# Altium integrated library Weidmueller_OMNIMATE_Signal.IntLib: 2550 symbols (part 18 of 45)
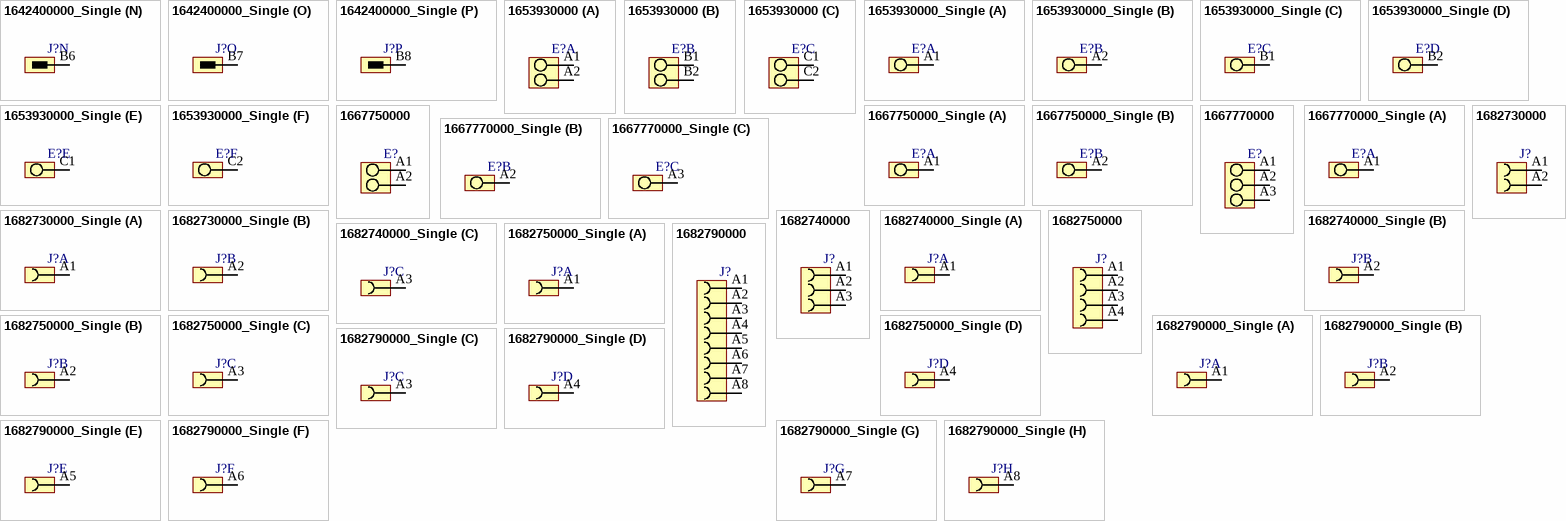
[diagram p228: symbols 1642400000_Single to 1682790000_Single]

## 1667750000_Single
designator E?
OMNIMATE Signal - series LM; PartNumber: 1667750000; Manufacturer: Weidmueller; Short_text_for_material: LM 3.50/02/90 3.2SN OR BX; Side_termination_characteristic: closed side; Mounting_onto_the_PCB: Solder connection; Pitch_mm: 3,5 mm; Pitch_inch: 0,138 inch; No_of_poles: 2; Solder_pin_length_mm: 3,2 mm; Contact_material: Cu-Leg; Contact_surface: tinned; Insulating_material: PA; UL_94_flammability_rating: V-2; Rated_voltage_for_surge_voltage_class_pollution_degree_II_2: 320 V; Rated_current_min_no_of_poles_TU_20_deg_C: 32 A; Solid_min_H05_07_V_U: 0,5 mm²; Solid_max_H05_07_V_U: 1,5 mm²; Rated_voltage_use_group_B_UL_1059: 300 V; Rated_current_use_group_B_UL_1059: 10 A; Wire_cross_section_AWG_min_UL_1059: AWG 28; Wire_cross_section_AWG_max_UL_1059: AWG 14; PackageReference: LM_3_5_90_02; Colour: Orange; Packaging: Box; Qty: 100 PCS; Revision: V1; ComponentLink1Description: Manufacturer URL; ComponentLink1URL: http://www.weidmueller.com/; ComponentLink2Description: URL Link1; ComponentLink2URL: http://catalog.weidmueller.com/catalog/Start.do?localeId=en&ObjectID=1667750000
footprint LM_3_5_90_02 (OMNIMATE Signal - Serie LM  LM 3.50/02/90 3.2)
part A pins: A1
part B pins: A2
1 alternate drawing of the same symbol

## 1667770000
designator E?
OMNIMATE Signal - series LM; PartNumber: 1667770000; Manufacturer: Weidmueller; Short_text_for_material: LM 3.50/03/90 3.2SN OR BX; Side_termination_characteristic: closed side; Mounting_onto_the_PCB: Solder connection; Pitch_mm: 3,5 mm; Pitch_inch: 0,138 inch; No_of_poles: 3; Solder_pin_length_mm: 3,2 mm; Contact_material: Cu-Leg; Contact_surface: tinned; Insulating_material: PA; UL_94_flammability_rating: V-2; Rated_voltage_for_surge_voltage_class_pollution_degree_II_2: 320 V; Rated_current_min_no_of_poles_TU_20_deg_C: 32 A; Solid_min_H05_07_V_U: 0,5 mm²; Solid_max_H05_07_V_U: 1,5 mm²; Rated_voltage_use_group_B_UL_1059: 300 V; Rated_current_use_group_B_UL_1059: 10 A; Wire_cross_section_AWG_min_UL_1059: AWG 28; Wire_cross_section_AWG_max_UL_1059: AWG 14; PackageReference: LM_3_5_90_03; Colour: Orange; Packaging: Box; Qty: 100 PCS; Revision: V1; ComponentLink1Description: Manufacturer URL; ComponentLink1URL: http://www.weidmueller.com/; ComponentLink2Description: URL Link1; ComponentLink2URL: http://catalog.weidmueller.com/catalog/Start.do?localeId=en&ObjectID=1667770000
footprint LM_3_5_90_03 (OMNIMATE Signal - Serie LM  LM 3.50/03/90 3.2)
pins: A1, A2, A3
1 alternate drawing of the same symbol

## 1667770000_Single
designator E?
OMNIMATE Signal - series LM; PartNumber: 1667770000; Manufacturer: Weidmueller; Short_text_for_material: LM 3.50/03/90 3.2SN OR BX; Side_termination_characteristic: closed side; Mounting_onto_the_PCB: Solder connection; Pitch_mm: 3,5 mm; Pitch_inch: 0,138 inch; No_of_poles: 3; Solder_pin_length_mm: 3,2 mm; Contact_material: Cu-Leg; Contact_surface: tinned; Insulating_material: PA; UL_94_flammability_rating: V-2; Rated_voltage_for_surge_voltage_class_pollution_degree_II_2: 320 V; Rated_current_min_no_of_poles_TU_20_deg_C: 32 A; Solid_min_H05_07_V_U: 0,5 mm²; Solid_max_H05_07_V_U: 1,5 mm²; Rated_voltage_use_group_B_UL_1059: 300 V; Rated_current_use_group_B_UL_1059: 10 A; Wire_cross_section_AWG_min_UL_1059: AWG 28; Wire_cross_section_AWG_max_UL_1059: AWG 14; PackageReference: LM_3_5_90_03; Colour: Orange; Packaging: Box; Qty: 100 PCS; Revision: V1; ComponentLink1Description: Manufacturer URL; ComponentLink1URL: http://www.weidmueller.com/; ComponentLink2Description: URL Link1; ComponentLink2URL: http://catalog.weidmueller.com/catalog/Start.do?localeId=en&ObjectID=1667770000
footprint LM_3_5_90_03 (OMNIMATE Signal - Serie LM  LM 3.50/03/90 3.2)
part A pins: A1
part B pins: A2
part C pins: A3
1 alternate drawing of the same symbol

## 1682730000
designator J?
OMNIMATE Signal - series BL/SL 5.08; PartNumber: 1682730000; Manufacturer: Weidmueller; Short_text_for_material: BLL 5.08/02/180B 3.2SN OR BX; Side_termination_characteristic: Dovetails for fixing blocks; Mounting_onto_the_PCB: Solder connection; Pitch_mm: 5.08 mm; Pitch_inch: 0.2 inch; No_of_poles: 2; Outgoing_elbow: 180°; Solder_pin_length_mm: 3.2 mm; Contact_material: Cu-Leg; Contact_surface: tinned; Insulating_material: PBT GF; UL_94_flammability_rating: V-0; Rated_voltage_for_surge_voltage_class_pollution_degree_II_2: 400 V; Rated_current_min_no_of_poles_TU_20_deg_C: 32 A; Rated_voltage_use_group_B_UL_1059: 300 V; Rated_current_use_group_B_UL_1059: 15 A; PackageReference: BLL_5_08_180B_02; Colour: Orange; Packaging: Box; Qty: 150 PCS; Revision: V1; ComponentLink1Description: Manufacturer URL; ComponentLink1URL: http://www.weidmueller.com/; ComponentLink2Description: URL Link1; ComponentLink2URL: http://catalog.weidmueller.com/catalog/Start.do?localeId=en&ObjectID=1682730000
footprint BLL_5_08_180B_02 (OMNIMATE Signal - Serie BL/SL 5.08  BLL 5.08/02/180B 3.2)
pins: A1, A2

## 1682730000_Single
designator J?
OMNIMATE Signal - series BL/SL 5.08; PartNumber: 1682730000; Manufacturer: Weidmueller; Short_text_for_material: BLL 5.08/02/180B 3.2SN OR BX; Side_termination_characteristic: Dovetails for fixing blocks; Mounting_onto_the_PCB: Solder connection; Pitch_mm: 5.08 mm; Pitch_inch: 0.2 inch; No_of_poles: 2; Outgoing_elbow: 180°; Solder_pin_length_mm: 3.2 mm; Contact_material: Cu-Leg; Contact_surface: tinned; Insulating_material: PBT GF; UL_94_flammability_rating: V-0; Rated_voltage_for_surge_voltage_class_pollution_degree_II_2: 400 V; Rated_current_min_no_of_poles_TU_20_deg_C: 32 A; Rated_voltage_use_group_B_UL_1059: 300 V; Rated_current_use_group_B_UL_1059: 15 A; PackageReference: BLL_5_08_180B_02; Colour: Orange; Packaging: Box; Qty: 150 PCS; Revision: V1; ComponentLink1Description: Manufacturer URL; ComponentLink1URL: http://www.weidmueller.com/; ComponentLink2Description: URL Link1; ComponentLink2URL: http://catalog.weidmueller.com/catalog/Start.do?localeId=en&ObjectID=1682730000
footprint BLL_5_08_180B_02 (OMNIMATE Signal - Serie BL/SL 5.08  BLL 5.08/02/180B 3.2)
part A pins: A1
part B pins: A2

## 1682740000
designator J?
OMNIMATE Signal - series BL/SL 5.08; PartNumber: 1682740000; Manufacturer: Weidmueller; Short_text_for_material: BLL 5.08/03/180B 3.2SN OR BX; Side_termination_characteristic: Dovetails for fixing blocks; Mounting_onto_the_PCB: Solder connection; Pitch_mm: 5.08 mm; Pitch_inch: 0.2 inch; No_of_poles: 3; Outgoing_elbow: 180°; Solder_pin_length_mm: 3.2 mm; Contact_material: Cu-Leg; Contact_surface: tinned; Insulating_material: PBT GF; UL_94_flammability_rating: V-0; Rated_voltage_for_surge_voltage_class_pollution_degree_II_2: 400 V; Rated_current_min_no_of_poles_TU_20_deg_C: 32 A; Rated_voltage_use_group_B_UL_1059: 300 V; Rated_current_use_group_B_UL_1059: 15 A; PackageReference: BLL_5_08_180B_03; Colour: Orange; Packaging: Box; Qty: 108 PCS; Revision: V1; ComponentLink1Description: Manufacturer URL; ComponentLink1URL: http://www.weidmueller.com/; ComponentLink2Description: URL Link1; ComponentLink2URL: http://catalog.weidmueller.com/catalog/Start.do?localeId=en&ObjectID=1682740000
footprint BLL_5_08_180B_03 (OMNIMATE Signal - Serie BL/SL 5.08  BLL 5.08/03/180B 3.2)
pins: A1, A2, A3

## 1682740000_Single
designator J?
OMNIMATE Signal - series BL/SL 5.08; PartNumber: 1682740000; Manufacturer: Weidmueller; Short_text_for_material: BLL 5.08/03/180B 3.2SN OR BX; Side_termination_characteristic: Dovetails for fixing blocks; Mounting_onto_the_PCB: Solder connection; Pitch_mm: 5.08 mm; Pitch_inch: 0.2 inch; No_of_poles: 3; Outgoing_elbow: 180°; Solder_pin_length_mm: 3.2 mm; Contact_material: Cu-Leg; Contact_surface: tinned; Insulating_material: PBT GF; UL_94_flammability_rating: V-0; Rated_voltage_for_surge_voltage_class_pollution_degree_II_2: 400 V; Rated_current_min_no_of_poles_TU_20_deg_C: 32 A; Rated_voltage_use_group_B_UL_1059: 300 V; Rated_current_use_group_B_UL_1059: 15 A; PackageReference: BLL_5_08_180B_03; Colour: Orange; Packaging: Box; Qty: 108 PCS; Revision: V1; ComponentLink1Description: Manufacturer URL; ComponentLink1URL: http://www.weidmueller.com/; ComponentLink2Description: URL Link1; ComponentLink2URL: http://catalog.weidmueller.com/catalog/Start.do?localeId=en&ObjectID=1682740000
footprint BLL_5_08_180B_03 (OMNIMATE Signal - Serie BL/SL 5.08  BLL 5.08/03/180B 3.2)
part A pins: A1
part B pins: A2
part C pins: A3

## 1682750000
designator J?
OMNIMATE Signal - series BL/SL 5.08; PartNumber: 1682750000; Manufacturer: Weidmueller; Short_text_for_material: BLL 5.08/04/180B 3.2SN OR BX; Side_termination_characteristic: Dovetails for fixing blocks; Mounting_onto_the_PCB: Solder connection; Pitch_mm: 5.08 mm; Pitch_inch: 0.2 inch; No_of_poles: 4; Outgoing_elbow: 180°; Solder_pin_length_mm: 3.2 mm; Contact_material: Cu-Leg; Contact_surface: tinned; Insulating_material: PBT GF; UL_94_flammability_rating: V-0; Rated_voltage_for_surge_voltage_class_pollution_degree_II_2: 400 V; Rated_current_min_no_of_poles_TU_20_deg_C: 32 A; Rated_voltage_use_group_B_UL_1059: 300 V; Rated_current_use_group_B_UL_1059: 15 A; PackageReference: BLL_5_08_180B_04; Colour: Orange; Packaging: Box; Qty: 78 PCS; Revision: V1; ComponentLink1Description: Manufacturer URL; ComponentLink1URL: http://www.weidmueller.com/; ComponentLink2Description: URL Link1; ComponentLink2URL: http://catalog.weidmueller.com/catalog/Start.do?localeId=en&ObjectID=1682750000
footprint BLL_5_08_180B_04 (OMNIMATE Signal - Serie BL/SL 5.08  BLL 5.08/04/180B 3.2)
pins: A1, A2, A3, A4

## 1682750000_Single
designator J?
OMNIMATE Signal - series BL/SL 5.08; PartNumber: 1682750000; Manufacturer: Weidmueller; Short_text_for_material: BLL 5.08/04/180B 3.2SN OR BX; Side_termination_characteristic: Dovetails for fixing blocks; Mounting_onto_the_PCB: Solder connection; Pitch_mm: 5.08 mm; Pitch_inch: 0.2 inch; No_of_poles: 4; Outgoing_elbow: 180°; Solder_pin_length_mm: 3.2 mm; Contact_material: Cu-Leg; Contact_surface: tinned; Insulating_material: PBT GF; UL_94_flammability_rating: V-0; Rated_voltage_for_surge_voltage_class_pollution_degree_II_2: 400 V; Rated_current_min_no_of_poles_TU_20_deg_C: 32 A; Rated_voltage_use_group_B_UL_1059: 300 V; Rated_current_use_group_B_UL_1059: 15 A; PackageReference: BLL_5_08_180B_04; Colour: Orange; Packaging: Box; Qty: 78 PCS; Revision: V1; ComponentLink1Description: Manufacturer URL; ComponentLink1URL: http://www.weidmueller.com/; ComponentLink2Description: URL Link1; ComponentLink2URL: http://catalog.weidmueller.com/catalog/Start.do?localeId=en&ObjectID=1682750000
footprint BLL_5_08_180B_04 (OMNIMATE Signal - Serie BL/SL 5.08  BLL 5.08/04/180B 3.2)
part A pins: A1
part B pins: A2
part C pins: A3
part D pins: A4

## 1682790000
designator J?
OMNIMATE Signal - series BL/SL 5.08; PartNumber: 1682790000; Manufacturer: Weidmueller; Short_text_for_material: BLL 5.08/08/180B 3.2SN OR BX; Side_termination_characteristic: Dovetails for fixing blocks; Mounting_onto_the_PCB: Solder connection; Pitch_mm: 5.08 mm; Pitch_inch: 0.2 inch; No_of_poles: 8; Outgoing_elbow: 180°; Solder_pin_length_mm: 3.2 mm; Contact_material: Cu-Leg; Contact_surface: tinned; Insulating_material: PBT GF; UL_94_flammability_rating: V-0; Rated_voltage_for_surge_voltage_class_pollution_degree_II_2: 400 V; Rated_current_min_no_of_poles_TU_20_deg_C: 32 A; Rated_voltage_use_group_B_UL_1059: 300 V; Rated_current_use_group_B_UL_1059: 15 A; PackageReference: BLL_5_08_180B_08; Colour: Orange; Packaging: Box; Qty: 42 PCS; Revision: V1; ComponentLink1Description: Manufacturer URL; ComponentLink1URL: http://www.weidmueller.com/; ComponentLink2Description: URL Link1; ComponentLink2URL: http://catalog.weidmueller.com/catalog/Start.do?localeId=en&ObjectID=1682790000
footprint BLL_5_08_180B_08 (OMNIMATE Signal - Serie BL/SL 5.08  BLL 5.08/08/180B 3.2)
pins: A1, A2, A3, A4, A5, A6, A7, A8

## 1682790000_Single
designator J?
OMNIMATE Signal - series BL/SL 5.08; PartNumber: 1682790000; Manufacturer: Weidmueller; Short_text_for_material: BLL 5.08/08/180B 3.2SN OR BX; Side_termination_characteristic: Dovetails for fixing blocks; Mounting_onto_the_PCB: Solder connection; Pitch_mm: 5.08 mm; Pitch_inch: 0.2 inch; No_of_poles: 8; Outgoing_elbow: 180°; Solder_pin_length_mm: 3.2 mm; Contact_material: Cu-Leg; Contact_surface: tinned; Insulating_material: PBT GF; UL_94_flammability_rating: V-0; Rated_voltage_for_surge_voltage_class_pollution_degree_II_2: 400 V; Rated_current_min_no_of_poles_TU_20_deg_C: 32 A; Rated_voltage_use_group_B_UL_1059: 300 V; Rated_current_use_group_B_UL_1059: 15 A; PackageReference: BLL_5_08_180B_08; Colour: Orange; Packaging: Box; Qty: 42 PCS; Revision: V1; ComponentLink1Description: Manufacturer URL; ComponentLink1URL: http://www.weidmueller.com/; ComponentLink2Description: URL Link1; ComponentLink2URL: http://catalog.weidmueller.com/catalog/Start.do?localeId=en&ObjectID=1682790000
footprint BLL_5_08_180B_08 (OMNIMATE Signal - Serie BL/SL 5.08  BLL 5.08/08/180B 3.2)
part A pins: A1
part B pins: A2
part C pins: A3
part D pins: A4
part E pins: A5
part F pins: A6
part G pins: A7
part H pins: A8

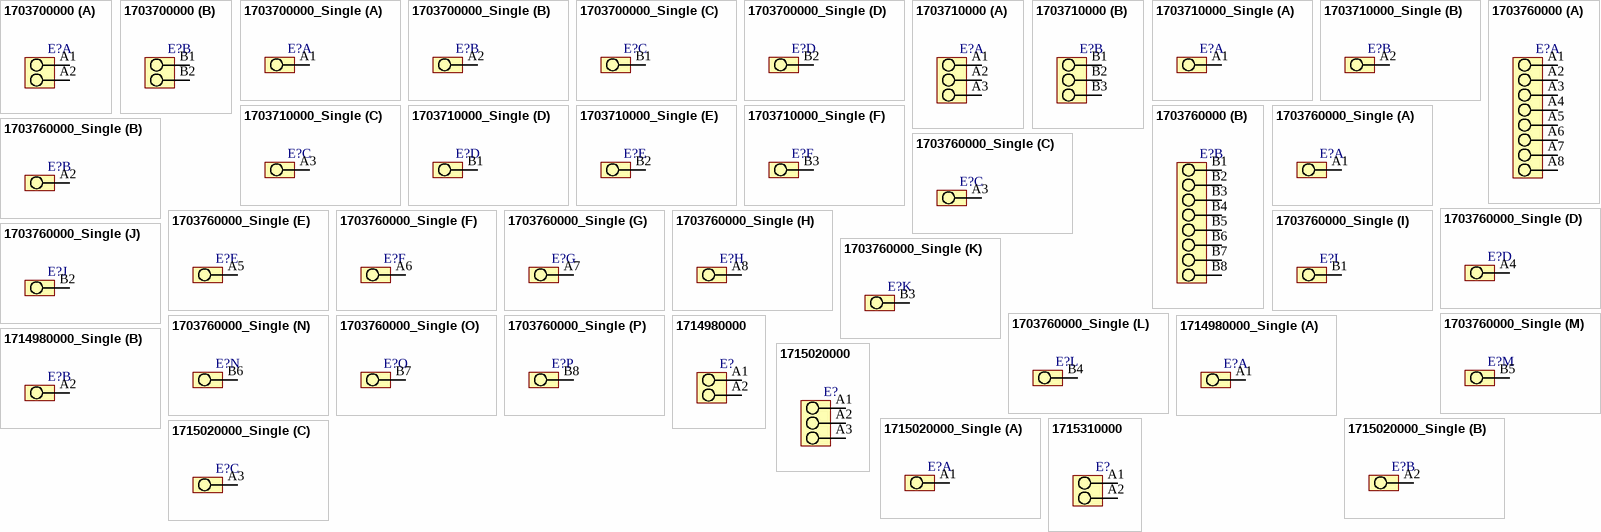
[diagram p98: symbols 1703700000 to 1715310000]

## 1703700000
designator E?
OMNIMATE Signal - series LM; PartNumber: 1703700000; Manufacturer: Weidmueller; Short_text_for_material: LM2N 3.50/04/90 3.2SN OR BX; Side_termination_characteristic: closed side; Mounting_onto_the_PCB: Solder connection; Pitch_mm: 3,5 mm; Pitch_inch: 0,138 inch; No_of_poles: 4; Solder_pin_length_mm: 3,2 mm; Contact_material: Cu-Leg; Contact_surface: tinned; Insulating_material: PA; UL_94_flammability_rating: V-2; Rated_voltage_for_surge_voltage_class_pollution_degree_II_2: 320 V; Solid_min_H05_07_V_U: 0,5 mm²; Solid_max_H05_07_V_U: 1,5 mm²; Rated_voltage_use_group_B_UL_1059: 300 V; Rated_current_use_group_B_UL_1059: 10 A; Wire_cross_section_AWG_min_UL_1059: AWG 28; Wire_cross_section_AWG_max_UL_1059: AWG 14; PackageReference: LM2N_3_5_04; Colour: Orange; Packaging: Box; Qty: 100 PCS; Revision: V1; ComponentLink1Description: Manufacturer URL; ComponentLink1URL: http://www.weidmueller.com/; ComponentLink2Description: URL Link1; ComponentLink2URL: http://catalog.weidmueller.com/catalog/Start.do?localeId=en&ObjectID=1703700000
footprint LM2N_3_5_04 (OMNIMATE Signal - Serie LM  LM2N 3.50/04/90 3.2)
part A pins: A1, A2
part B pins: B1, B2
1 alternate drawing of the same symbol

## 1703700000_Single
designator E?
OMNIMATE Signal - series LM; PartNumber: 1703700000; Manufacturer: Weidmueller; Short_text_for_material: LM2N 3.50/04/90 3.2SN OR BX; Side_termination_characteristic: closed side; Mounting_onto_the_PCB: Solder connection; Pitch_mm: 3,5 mm; Pitch_inch: 0,138 inch; No_of_poles: 4; Solder_pin_length_mm: 3,2 mm; Contact_material: Cu-Leg; Contact_surface: tinned; Insulating_material: PA; UL_94_flammability_rating: V-2; Rated_voltage_for_surge_voltage_class_pollution_degree_II_2: 320 V; Solid_min_H05_07_V_U: 0,5 mm²; Solid_max_H05_07_V_U: 1,5 mm²; Rated_voltage_use_group_B_UL_1059: 300 V; Rated_current_use_group_B_UL_1059: 10 A; Wire_cross_section_AWG_min_UL_1059: AWG 28; Wire_cross_section_AWG_max_UL_1059: AWG 14; PackageReference: LM2N_3_5_04; Colour: Orange; Packaging: Box; Qty: 100 PCS; Revision: V1; ComponentLink1Description: Manufacturer URL; ComponentLink1URL: http://www.weidmueller.com/; ComponentLink2Description: URL Link1; ComponentLink2URL: http://catalog.weidmueller.com/catalog/Start.do?localeId=en&ObjectID=1703700000
footprint LM2N_3_5_04 (OMNIMATE Signal - Serie LM  LM2N 3.50/04/90 3.2)
part A pins: A1
part B pins: A2
part C pins: B1
part D pins: B2
1 alternate drawing of the same symbol

## 1703710000
designator E?
OMNIMATE Signal - series LM; PartNumber: 1703710000; Manufacturer: Weidmueller; Short_text_for_material: LM2N 3.50/06/90 3.2SN OR BX; Side_termination_characteristic: closed side; Mounting_onto_the_PCB: Solder connection; Pitch_mm: 3,5 mm; Pitch_inch: 0,138 inch; No_of_poles: 6; Solder_pin_length_mm: 3,2 mm; Contact_material: Cu-Leg; Contact_surface: tinned; Insulating_material: PA; UL_94_flammability_rating: V-2; Rated_voltage_for_surge_voltage_class_pollution_degree_II_2: 320 V; Solid_min_H05_07_V_U: 0,5 mm²; Solid_max_H05_07_V_U: 1,5 mm²; Rated_voltage_use_group_B_UL_1059: 300 V; Rated_current_use_group_B_UL_1059: 10 A; Wire_cross_section_AWG_min_UL_1059: AWG 28; Wire_cross_section_AWG_max_UL_1059: AWG 14; PackageReference: LM2N_3_5_06; Colour: Orange; Packaging: Box; Qty: 100 PCS; Revision: V1; ComponentLink1Description: Manufacturer URL; ComponentLink1URL: http://www.weidmueller.com/; ComponentLink2Description: URL Link1; ComponentLink2URL: http://catalog.weidmueller.com/catalog/Start.do?localeId=en&ObjectID=1703710000
footprint LM2N_3_5_06 (OMNIMATE Signal - Serie LM  LM2N 3.50/06/90 3.2)
part A pins: A1, A2, A3
part B pins: B1, B2, B3
1 alternate drawing of the same symbol

## 1703710000_Single
designator E?
OMNIMATE Signal - series LM; PartNumber: 1703710000; Manufacturer: Weidmueller; Short_text_for_material: LM2N 3.50/06/90 3.2SN OR BX; Side_termination_characteristic: closed side; Mounting_onto_the_PCB: Solder connection; Pitch_mm: 3,5 mm; Pitch_inch: 0,138 inch; No_of_poles: 6; Solder_pin_length_mm: 3,2 mm; Contact_material: Cu-Leg; Contact_surface: tinned; Insulating_material: PA; UL_94_flammability_rating: V-2; Rated_voltage_for_surge_voltage_class_pollution_degree_II_2: 320 V; Solid_min_H05_07_V_U: 0,5 mm²; Solid_max_H05_07_V_U: 1,5 mm²; Rated_voltage_use_group_B_UL_1059: 300 V; Rated_current_use_group_B_UL_1059: 10 A; Wire_cross_section_AWG_min_UL_1059: AWG 28; Wire_cross_section_AWG_max_UL_1059: AWG 14; PackageReference: LM2N_3_5_06; Colour: Orange; Packaging: Box; Qty: 100 PCS; Revision: V1; ComponentLink1Description: Manufacturer URL; ComponentLink1URL: http://www.weidmueller.com/; ComponentLink2Description: URL Link1; ComponentLink2URL: http://catalog.weidmueller.com/catalog/Start.do?localeId=en&ObjectID=1703710000
footprint LM2N_3_5_06 (OMNIMATE Signal - Serie LM  LM2N 3.50/06/90 3.2)
part A pins: A1
part B pins: A2
part C pins: A3
part D pins: B1
part E pins: B2
part F pins: B3
1 alternate drawing of the same symbol

## 1703760000
designator E?
OMNIMATE Signal - series LM; PartNumber: 1703760000; Manufacturer: Weidmueller; Short_text_for_material: LM2N 3.50/16/90 3.2SN OR BX; Side_termination_characteristic: closed side; Mounting_onto_the_PCB: Solder connection; Pitch_mm: 3,5 mm; Pitch_inch: 0,138 inch; No_of_poles: 16; Solder_pin_length_mm: 3,2 mm; Contact_material: Cu-Leg; Contact_surface: tinned; Insulating_material: PA; UL_94_flammability_rating: V-2; Rated_voltage_for_surge_voltage_class_pollution_degree_II_2: 320 V; Solid_min_H05_07_V_U: 0,5 mm²; Solid_max_H05_07_V_U: 1,5 mm²; Rated_voltage_use_group_B_UL_1059: 300 V; Rated_current_use_group_B_UL_1059: 10 A; Wire_cross_section_AWG_min_UL_1059: AWG 28; Wire_cross_section_AWG_max_UL_1059: AWG 14; PackageReference: LM2N_3_5_16; Colour: Orange; Packaging: Box; Qty: 50 PCS; Revision: V1; ComponentLink1Description: Manufacturer URL; ComponentLink1URL: http://www.weidmueller.com/; ComponentLink2Description: URL Link1; ComponentLink2URL: http://catalog.weidmueller.com/catalog/Start.do?localeId=en&ObjectID=1703760000
footprint LM2N_3_5_16 (OMNIMATE Signal - Serie LM  LM2N 3.50/16/90 3.2)
part A pins: A1, A2, A3, A4, A5, A6, A7, A8
part B pins: B1, B2, B3, B4, B5, B6, B7, B8
1 alternate drawing of the same symbol

## 1703760000_Single
designator E?
OMNIMATE Signal - series LM; PartNumber: 1703760000; Manufacturer: Weidmueller; Short_text_for_material: LM2N 3.50/16/90 3.2SN OR BX; Side_termination_characteristic: closed side; Mounting_onto_the_PCB: Solder connection; Pitch_mm: 3,5 mm; Pitch_inch: 0,138 inch; No_of_poles: 16; Solder_pin_length_mm: 3,2 mm; Contact_material: Cu-Leg; Contact_surface: tinned; Insulating_material: PA; UL_94_flammability_rating: V-2; Rated_voltage_for_surge_voltage_class_pollution_degree_II_2: 320 V; Solid_min_H05_07_V_U: 0,5 mm²; Solid_max_H05_07_V_U: 1,5 mm²; Rated_voltage_use_group_B_UL_1059: 300 V; Rated_current_use_group_B_UL_1059: 10 A; Wire_cross_section_AWG_min_UL_1059: AWG 28; Wire_cross_section_AWG_max_UL_1059: AWG 14; PackageReference: LM2N_3_5_16; Colour: Orange; Packaging: Box; Qty: 50 PCS; Revision: V1; ComponentLink1Description: Manufacturer URL; ComponentLink1URL: http://www.weidmueller.com/; ComponentLink2Description: URL Link1; ComponentLink2URL: http://catalog.weidmueller.com/catalog/Start.do?localeId=en&ObjectID=1703760000
footprint LM2N_3_5_16 (OMNIMATE Signal - Serie LM  LM2N 3.50/16/90 3.2)
part A pins: A1
part B pins: A2
part C pins: A3
part D pins: A4
part E pins: A5
part F pins: A6
part G pins: A7
part H pins: A8
part I pins: B1
part J pins: B2
part K pins: B3
part L pins: B4
part M pins: B5
part N pins: B6
part O pins: B7
part P pins: B8
1 alternate drawing of the same symbol

## 1714980000
designator E?
OMNIMATE Signal - series LM; PartNumber: 1714980000; Manufacturer: Weidmueller; Short_text_for_material: LM 3.50/02/135 3.2SN OR BX; Side_termination_characteristic: closed side; Mounting_onto_the_PCB: Solder connection; Pitch_mm: 3,5 mm; Pitch_inch: 0,138 inch; No_of_poles: 2; Solder_pin_length_mm: 3,2 mm; Contact_material: Cu-Leg; Contact_surface: tinned; Insulating_material: PA; UL_94_flammability_rating: V-2; Rated_voltage_for_surge_voltage_class_pollution_degree_II_2: 320 V; Solid_min_H05_07_V_U: 0,5 mm²; Solid_max_H05_07_V_U: 1,5 mm²; Rated_voltage_use_group_B_UL_1059: 300 V; Rated_current_use_group_B_UL_1059: 10 A; Wire_cross_section_AWG_min_UL_1059: AWG 28; Wire_cross_section_AWG_max_UL_1059: AWG 14; PackageReference: LM_3_5_135_02; Colour: Orange; Packaging: Box; Qty: 100 PCS; Revision: V1; ComponentLink1Description: Manufacturer URL; ComponentLink1URL: http://www.weidmueller.com/; ComponentLink2Description: URL Link1; ComponentLink2URL: http://catalog.weidmueller.com/catalog/Start.do?localeId=en&ObjectID=1714980000
footprint LM_3_5_135_02 (OMNIMATE Signal - Serie LM  LM 3.50/02/135 3.2)
pins: A1, A2
1 alternate drawing of the same symbol

## 1714980000_Single
designator E?
OMNIMATE Signal - series LM; PartNumber: 1714980000; Manufacturer: Weidmueller; Short_text_for_material: LM 3.50/02/135 3.2SN OR BX; Side_termination_characteristic: closed side; Mounting_onto_the_PCB: Solder connection; Pitch_mm: 3,5 mm; Pitch_inch: 0,138 inch; No_of_poles: 2; Solder_pin_length_mm: 3,2 mm; Contact_material: Cu-Leg; Contact_surface: tinned; Insulating_material: PA; UL_94_flammability_rating: V-2; Rated_voltage_for_surge_voltage_class_pollution_degree_II_2: 320 V; Solid_min_H05_07_V_U: 0,5 mm²; Solid_max_H05_07_V_U: 1,5 mm²; Rated_voltage_use_group_B_UL_1059: 300 V; Rated_current_use_group_B_UL_1059: 10 A; Wire_cross_section_AWG_min_UL_1059: AWG 28; Wire_cross_section_AWG_max_UL_1059: AWG 14; PackageReference: LM_3_5_135_02; Colour: Orange; Packaging: Box; Qty: 100 PCS; Revision: V1; ComponentLink1Description: Manufacturer URL; ComponentLink1URL: http://www.weidmueller.com/; ComponentLink2Description: URL Link1; ComponentLink2URL: http://catalog.weidmueller.com/catalog/Start.do?localeId=en&ObjectID=1714980000
footprint LM_3_5_135_02 (OMNIMATE Signal - Serie LM  LM 3.50/02/135 3.2)
part A pins: A1
part B pins: A2
1 alternate drawing of the same symbol

## 1715020000
designator E?
OMNIMATE Signal - series LM; PartNumber: 1715020000; Manufacturer: Weidmueller; Short_text_for_material: LM 3.50/03/135 3.2SN OR BX; Side_termination_characteristic: closed side; Mounting_onto_the_PCB: Solder connection; Pitch_mm: 3,5 mm; Pitch_inch: 0,138 inch; No_of_poles: 3; Solder_pin_length_mm: 3,2 mm; Contact_material: Cu-Leg; Contact_surface: tinned; Insulating_material: PA; UL_94_flammability_rating: V-2; Rated_voltage_for_surge_voltage_class_pollution_degree_II_2: 320 V; Solid_min_H05_07_V_U: 0,5 mm²; Solid_max_H05_07_V_U: 1,5 mm²; Rated_voltage_use_group_B_UL_1059: 300 V; Rated_current_use_group_B_UL_1059: 10 A; Wire_cross_section_AWG_min_UL_1059: AWG 28; Wire_cross_section_AWG_max_UL_1059: AWG 14; PackageReference: LM_3_5_135_03; Colour: Orange; Packaging: Box; Qty: 100 PCS; Revision: V1; ComponentLink1Description: Manufacturer URL; ComponentLink1URL: http://www.weidmueller.com/; ComponentLink2Description: URL Link1; ComponentLink2URL: http://catalog.weidmueller.com/catalog/Start.do?localeId=en&ObjectID=1715020000
footprint LM_3_5_135_03 (OMNIMATE Signal - Serie LM  LM 3.50/03/135 3.2)
pins: A1, A2, A3
1 alternate drawing of the same symbol

## 1715020000_Single
designator E?
OMNIMATE Signal - series LM; PartNumber: 1715020000; Manufacturer: Weidmueller; Short_text_for_material: LM 3.50/03/135 3.2SN OR BX; Side_termination_characteristic: closed side; Mounting_onto_the_PCB: Solder connection; Pitch_mm: 3,5 mm; Pitch_inch: 0,138 inch; No_of_poles: 3; Solder_pin_length_mm: 3,2 mm; Contact_material: Cu-Leg; Contact_surface: tinned; Insulating_material: PA; UL_94_flammability_rating: V-2; Rated_voltage_for_surge_voltage_class_pollution_degree_II_2: 320 V; Solid_min_H05_07_V_U: 0,5 mm²; Solid_max_H05_07_V_U: 1,5 mm²; Rated_voltage_use_group_B_UL_1059: 300 V; Rated_current_use_group_B_UL_1059: 10 A; Wire_cross_section_AWG_min_UL_1059: AWG 28; Wire_cross_section_AWG_max_UL_1059: AWG 14; PackageReference: LM_3_5_135_03; Colour: Orange; Packaging: Box; Qty: 100 PCS; Revision: V1; ComponentLink1Description: Manufacturer URL; ComponentLink1URL: http://www.weidmueller.com/; ComponentLink2Description: URL Link1; ComponentLink2URL: http://catalog.weidmueller.com/catalog/Start.do?localeId=en&ObjectID=1715020000
footprint LM_3_5_135_03 (OMNIMATE Signal - Serie LM  LM 3.50/03/135 3.2)
part A pins: A1
part B pins: A2
part C pins: A3
1 alternate drawing of the same symbol

## 1715310000
designator E?
OMNIMATE Signal - series LM; PartNumber: 1715310000; Manufacturer: Weidmueller; Short_text_for_material: LM 5.00/02/90 3.5SN OR BX; Side_termination_characteristic: closed side; Mounting_onto_the_PCB: Solder connection; Pitch_mm: 5 mm; Pitch_inch: 0,197 inch; No_of_poles: 2; Solder_pin_length_mm: 3,5 mm; Contact_material: Cu-Leg; Contact_surface: tinned; Insulating_material: Wemid (PA); UL_94_flammability_rating: V-0; Rated_voltage_for_surge_voltage_class_pollution_degree_II_2: 630 V; Solid_min_H05_07_V_U: 0,2 mm²; Solid_max_H05_07_V_U: 2,5 mm²; Rated_voltage_use_group_B_UL_1059: 300 V; Rated_current_use_group_B_UL_1059: 15 A; Wire_cross_section_AWG_min_UL_1059: AWG 24; Wire_cross_section_AWG_max_UL_1059: AWG 14; PackageReference: LM_5_00_90_02; Colour: Orange; Packaging: Box; Qty: 500 PCS; Revision: V1; ComponentLink1Description: Manufacturer URL; ComponentLink1URL: http://www.weidmueller.com/; ComponentLink2Description: URL Link1; ComponentLink2URL: http://catalog.weidmueller.com/catalog/Start.do?localeId=en&ObjectID=1715310000
footprint LM_5_00_90_02 (OMNIMATE Signal - Serie LM  LM 5.00/02/90 3.5)
pins: A1, A2
1 alternate drawing of the same symbol

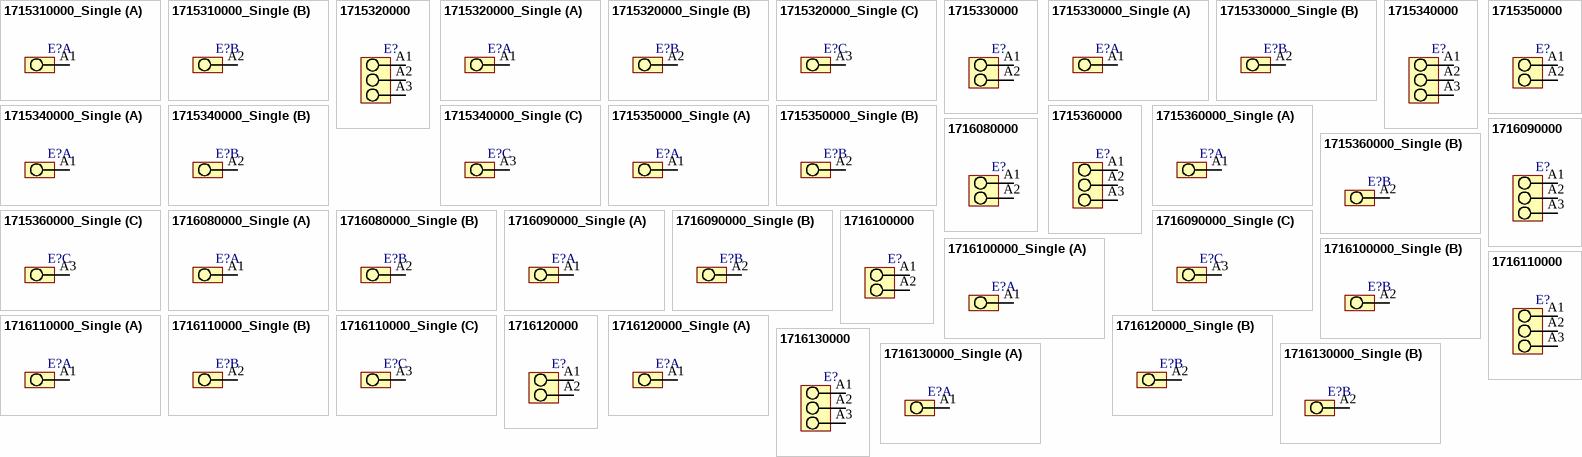
[diagram p99: symbols 1715310000_Single to 1716130000_Single]

## 1715310000_Single
designator E?
OMNIMATE Signal - series LM; PartNumber: 1715310000; Manufacturer: Weidmueller; Short_text_for_material: LM 5.00/02/90 3.5SN OR BX; Side_termination_characteristic: closed side; Mounting_onto_the_PCB: Solder connection; Pitch_mm: 5 mm; Pitch_inch: 0,197 inch; No_of_poles: 2; Solder_pin_length_mm: 3,5 mm; Contact_material: Cu-Leg; Contact_surface: tinned; Insulating_material: Wemid (PA); UL_94_flammability_rating: V-0; Rated_voltage_for_surge_voltage_class_pollution_degree_II_2: 630 V; Solid_min_H05_07_V_U: 0,2 mm²; Solid_max_H05_07_V_U: 2,5 mm²; Rated_voltage_use_group_B_UL_1059: 300 V; Rated_current_use_group_B_UL_1059: 15 A; Wire_cross_section_AWG_min_UL_1059: AWG 24; Wire_cross_section_AWG_max_UL_1059: AWG 14; PackageReference: LM_5_00_90_02; Colour: Orange; Packaging: Box; Qty: 500 PCS; Revision: V1; ComponentLink1Description: Manufacturer URL; ComponentLink1URL: http://www.weidmueller.com/; ComponentLink2Description: URL Link1; ComponentLink2URL: http://catalog.weidmueller.com/catalog/Start.do?localeId=en&ObjectID=1715310000
footprint LM_5_00_90_02 (OMNIMATE Signal - Serie LM  LM 5.00/02/90 3.5)
part A pins: A1
part B pins: A2
1 alternate drawing of the same symbol

## 1715320000
designator E?
OMNIMATE Signal - series LM; PartNumber: 1715320000; Manufacturer: Weidmueller; Short_text_for_material: LM 5.00/03/90 3.5SN OR BX; Side_termination_characteristic: closed side; Mounting_onto_the_PCB: Solder connection; Pitch_mm: 5 mm; Pitch_inch: 0,197 inch; No_of_poles: 3; Solder_pin_length_mm: 3,5 mm; Contact_material: Cu-Leg; Contact_surface: tinned; Insulating_material: Wemid (PA); UL_94_flammability_rating: V-0; Rated_voltage_for_surge_voltage_class_pollution_degree_II_2: 630 V; Solid_min_H05_07_V_U: 0,2 mm²; Solid_max_H05_07_V_U: 2,5 mm²; Rated_voltage_use_group_B_UL_1059: 300 V; Rated_current_use_group_B_UL_1059: 15 A; Wire_cross_section_AWG_min_UL_1059: AWG 24; Wire_cross_section_AWG_max_UL_1059: AWG 14; PackageReference: LM_5_00_90_03; Colour: Orange; Packaging: Box; Qty: 500 PCS; Revision: V1; ComponentLink1Description: Manufacturer URL; ComponentLink1URL: http://www.weidmueller.com/; ComponentLink2Description: URL Link1; ComponentLink2URL: http://catalog.weidmueller.com/catalog/Start.do?localeId=en&ObjectID=1715320000
footprint LM_5_00_90_03 (OMNIMATE Signal - Serie LM  LM 5.00/03/90 3.5)
pins: A1, A2, A3
1 alternate drawing of the same symbol

## 1715320000_Single
designator E?
OMNIMATE Signal - series LM; PartNumber: 1715320000; Manufacturer: Weidmueller; Short_text_for_material: LM 5.00/03/90 3.5SN OR BX; Side_termination_characteristic: closed side; Mounting_onto_the_PCB: Solder connection; Pitch_mm: 5 mm; Pitch_inch: 0,197 inch; No_of_poles: 3; Solder_pin_length_mm: 3,5 mm; Contact_material: Cu-Leg; Contact_surface: tinned; Insulating_material: Wemid (PA); UL_94_flammability_rating: V-0; Rated_voltage_for_surge_voltage_class_pollution_degree_II_2: 630 V; Solid_min_H05_07_V_U: 0,2 mm²; Solid_max_H05_07_V_U: 2,5 mm²; Rated_voltage_use_group_B_UL_1059: 300 V; Rated_current_use_group_B_UL_1059: 15 A; Wire_cross_section_AWG_min_UL_1059: AWG 24; Wire_cross_section_AWG_max_UL_1059: AWG 14; PackageReference: LM_5_00_90_03; Colour: Orange; Packaging: Box; Qty: 500 PCS; Revision: V1; ComponentLink1Description: Manufacturer URL; ComponentLink1URL: http://www.weidmueller.com/; ComponentLink2Description: URL Link1; ComponentLink2URL: http://catalog.weidmueller.com/catalog/Start.do?localeId=en&ObjectID=1715320000
footprint LM_5_00_90_03 (OMNIMATE Signal - Serie LM  LM 5.00/03/90 3.5)
part A pins: A1
part B pins: A2
part C pins: A3
1 alternate drawing of the same symbol

## 1715330000
designator E?
OMNIMATE Signal - series LM; PartNumber: 1715330000; Manufacturer: Weidmueller; Short_text_for_material: LM 5.00/02/180 3.5SN OR BX; Side_termination_characteristic: closed side; Mounting_onto_the_PCB: Solder connection; Pitch_mm: 5 mm; Pitch_inch: 0,197 inch; No_of_poles: 2; Solder_pin_length_mm: 3,5 mm; Contact_material: Cu-Leg; Contact_surface: tinned; Insulating_material: Wemid (PA); UL_94_flammability_rating: V-0; Rated_voltage_for_surge_voltage_class_pollution_degree_II_2: 630 V; Solid_min_H05_07_V_U: 0,2 mm²; Solid_max_H05_07_V_U: 2,5 mm²; Rated_voltage_use_group_B_UL_1059: 300 V; Rated_current_use_group_B_UL_1059: 15 A; Wire_cross_section_AWG_min_UL_1059: AWG 24; Wire_cross_section_AWG_max_UL_1059: AWG 14; PackageReference: LM_5_00_180_02; Colour: Orange; Packaging: Box; Qty: 500 PCS; Revision: V1; ComponentLink1Description: Manufacturer URL; ComponentLink1URL: http://www.weidmueller.com/; ComponentLink2Description: URL Link1; ComponentLink2URL: http://catalog.weidmueller.com/catalog/Start.do?localeId=en&ObjectID=1715330000
footprint LM_5_00_180_02 (OMNIMATE Signal - Serie LM  LM 5.00/02/180 3.5)
pins: A1, A2
1 alternate drawing of the same symbol

## 1715330000_Single
designator E?